# Altium footprint library 13-Pcblib_MCU.PcbLib: 48 footprints (part 1 of 3) (continued)
## FBGA-521 [mm] "BGA, 521-Leads, Body 14.0x14.0mm,  Pitch 0.50mm" (continued)
Top Overlay:
  region: -6.742,7 -7,6.742 -7,7
  region: -7.239,7.239 -7.239,7.739 -7.739,7.239
  lines w0.2: -7,6.742 -6.742,7 ; -7,-7 -7,7 7,7 7,-7 -7,-7
Mechanical 13:
  lines w0.1: -7,-7 -7,7 7,7 7,-7 -7,-7
Mechanical 15:
  lines w0.1: -0.5,0 0.5,0 ; 0,-0.5 0,0.5 ; -8,-8 -8,8 8,8 8,-8 -8,-8
3D body: height 1.5, standoff 0.3, extent -7,-7 7,7

## FBGA-580 [mm] "BGA, 580-Leads, Body 14.0x14.0mm,  Pitch 0.50mm"
height 1.5
pads (580):
  round 0.3 smd: A1(-6.5,6.5) A2(-6,6.5) A3(-5.5,6.5) A4(-5,6.5) A5(-4.5,6.5) A6(-4,6.5) A7(-3.5,6.5) A8(-3,6.5) A9(-2.5,6.5) A10(-2,6.5) A11(-1.5,6.5) A12(-1,6.5) A13(-0.5,6.5) A14(0,6.5) A15(0.5,6.5) A16(1,6.5) A17(1.5,6.5) A18(2,6.5) A19(2.5,6.5) A20(3,6.5) A21(3.5,6.5) A22(4,6.5) A23(4.5,6.5) A24(5,6.5) A25(5.5,6.5) A26(6,6.5) A27(6.5,6.5) AA1(-6.5,-3.5) AA2(-6,-3.5) AA3(-5.5,-3.5) AA4(-5,-3.5) AA6(-4,-3.5) AA7(-3.5,-3.5) AA8(-3,-3.5) AA9(-2.5,-3.5) AA10(-2,-3.5) AA11(-1.5,-3.5) AA12(-1,-3.5) AA13(-0.5,-3.5) AA14(0,-3.5) AA15(0.5,-3.5) AA16(1,-3.5) AA17(1.5,-3.5) AA18(2,-3.5) AA19(2.5,-3.5) AA20(3,-3.5) AA21(3.5,-3.5) AA22(4,-3.5) AA24(5,-3.5) AA25(5.5,-3.5) AA26(6,-3.5) AA27(6.5,-3.5) AB1(-6.5,-4) AB2(-6,-4) AB3(-5.5,-4) AB7(-3.5,-4) AB8(-3,-4) AB9(-2.5,-4) AB10(-2,-4) AB11(-1.5,-4) AB12(-1,-4) AB13(-0.5,-4) AB14(0,-4) AB15(0.5,-4) AB16(1,-4) AB17(1.5,-4) AB18(2,-4) AB19(2.5,-4) AB20(3,-4) AB21(3.5,-4) AB25(5.5,-4) AB26(6,-4) AB27(6.5,-4) AC1(-6.5,-4.5) AC2(-6,-4.5) AC3(-5.5,-4.5) AC25(5.5,-4.5) AC26(6,-4.5) AC27(6.5,-4.5) AD1(-6.5,-5) AD2(-6,-5) AD3(-5.5,-5) AD7(-3.5,-5) AD8(-3,-5) AD9(-2.5,-5) AD10(-2,-5) AD11(-1.5,-5) AD12(-1,-5) AD13(-0.5,-5) AD14(0,-5) AD15(0.5,-5) AD16(1,-5) AD17(1.5,-5) AD18(2,-5) AD19(2.5,-5) AD20(3,-5) AD21(3.5,-5) AD25(5.5,-5) AD26(6,-5) AD27(6.5,-5) AE1(-6.5,-5.5) AE2(-6,-5.5) AE3(-5.5,-5.5) AE4(-5,-5.5) AE5(-4.5,-5.5) AE6(-4,-5.5) AE7(-3.5,-5.5) AE8(-3,-5.5) AE9(-2.5,-5.5) AE10(-2,-5.5) AE11(-1.5,-5.5) AE12(-1,-5.5) AE13(-0.5,-5.5) AE14(0,-5.5) AE15(0.5,-5.5) AE16(1,-5.5) AE17(1.5,-5.5) AE18(2,-5.5) AE19(2.5,-5.5) AE20(3,-5.5) AE21(3.5,-5.5) AE22(4,-5.5) AE23(4.5,-5.5) AE24(5,-5.5) AE25(5.5,-5.5) AE26(6,-5.5) AE27(6.5,-5.5) AF1(-6.5,-6) AF2(-6,-6) AF3(-5.5,-6) AF4(-5,-6) AF5(-4.5,-6) AF6(-4,-6) AF7(-3.5,-6) AF8(-3,-6) AF9(-2.5,-6) AF10(-2,-6) AF11(-1.5,-6) AF12(-1,-6) AF13(-0.5,-6) AF14(0,-6) AF15(0.5,-6) AF16(1,-6) AF17(1.5,-6) AF18(2,-6) AF19(2.5,-6) AF20(3,-6) AF21(3.5,-6) AF22(4,-6) AF23(4.5,-6) AF24(5,-6) AF25(5.5,-6) AF26(6,-6) AF27(6.5,-6) AG1(-6.5,-6.5) AG2(-6,-6.5) AG3(-5.5,-6.5) AG4(-5,-6.5) AG5(-4.5,-6.5) AG6(-4,-6.5) AG7(-3.5,-6.5) AG8(-3,-6.5) AG9(-2.5,-6.5) AG10(-2,-6.5) AG11(-1.5,-6.5) AG12(-1,-6.5) AG13(-0.5,-6.5) AG14(0,-6.5) AG15(0.5,-6.5) AG16(1,-6.5) AG17(1.5,-6.5) AG18(2,-6.5) AG19(2.5,-6.5) AG20(3,-6.5) AG21(3.5,-6.5) AG22(4,-6.5) AG23(4.5,-6.5) AG24(5,-6.5) AG25(5.5,-6.5) AG26(6,-6.5) AG27(6.5,-6.5) B1(-6.5,6) B2(-6,6) B3(-5.5,6) B4(-5,6) B5(-4.5,6) B6(-4,6) B7(-3.5,6) B8(-3,6) B9(-2.5,6) B10(-2,6) B11(-1.5,6) B12(-1,6) B13(-0.5,6) B14(0,6) B15(0.5,6) B16(1,6) B17(1.5,6) B18(2,6) B19(2.5,6) B20(3,6) B21(3.5,6) B22(4,6) B23(4.5,6) B24(5,6) B25(5.5,6) B26(6,6) B27(6.5,6) C1(-6.5,5.5) C2(-6,5.5) C3(-5.5,5.5) C4(-5,5.5) C5(-4.5,5.5) C6(-4,5.5) C7(-3.5,5.5) C8(-3,5.5) C9(-2.5,5.5) C10(-2,5.5) C11(-1.5,5.5) C12(-1,5.5) C13(-0.5,5.5) C14(0,5.5) C15(0.5,5.5) C16(1,5.5) C17(1.5,5.5) C18(2,5.5) C19(2.5,5.5) C20(3,5.5) C21(3.5,5.5) C22(4,5.5) C23(4.5,5.5) C24(5,5.5) C25(5.5,5.5) C26(6,5.5) C27(6.5,5.5) D1(-6.5,5) D2(-6,5) D3(-5.5,5) D7(-3.5,5) D8(-3,5) D9(-2.5,5) D10(-2,5) D11(-1.5,5) D12(-1,5) D13(-0.5,5) D14(0,5) D15(0.5,5) D16(1,5) D17(1.5,5) D18(2,5) D19(2.5,5) D20(3,5) D21(3.5,5) D25(5.5,5) D26(6,5) D27(6.5,5) E1(-6.5,4.5) E2(-6,4.5) E3(-5.5,4.5) E25(5.5,4.5) E26(6,4.5) E27(6.5,4.5) F1(-6.5,4) F2(-6,4) F3(-5.5,4) F7(-3.5,4) F8(-3,4) F9(-2.5,4) F10(-2,4) F11(-1.5,4) F12(-1,4) F13(-0.5,4) F14(0,4) F15(0.5,4) F16(1,4) F17(1.5,4) F18(2,4) F19(2.5,4) F20(3,4) F21(3.5,4) F25(5.5,4) F26(6,4) F27(6.5,4) G1(-6.5,3.5) G2(-6,3.5) G3(-5.5,3.5) G4(-5,3.5) G6(-4,3.5) G7(-3.5,3.5) G8(-3,3.5) G9(-2.5,3.5) G10(-2,3.5) G11(-1.5,3.5) G12(-1,3.5) G13(-0.5,3.5) G14(0,3.5) G15(0.5,3.5) G16(1,3.5) G17(1.5,3.5) G18(2,3.5) G19(2.5,3.5) G20(3,3.5) G21(3.5,3.5) G22(4,3.5) G24(5,3.5) G25(5.5,3.5) G26(6,3.5) G27(6.5,3.5) H1(-6.5,3) H2(-6,3) H3(-5.5,3) H4(-5,3) H6(-4,3) H7(-3.5,3) H8(-3,3) H9(-2.5,3) H10(-2,3) H11(-1.5,3) H12(-1,3) H13(-0.5,3) H14(0,3) H15(0.5,3) H16(1,3) H17(1.5,3) H18(2,3) H19(2.5,3) H20(3,3) H21(3.5,3) H22(4,3) H24(5,3) H25(5.5,3) H26(6,3) H27(6.5,3) J1(-6.5,2.5) J2(-6,2.5) J3(-5.5,2.5) J4(-5,2.5) J6(-4,2.5) J7(-3.5,2.5) J8(-3,2.5) J20(3,2.5) J21(3.5,2.5) J22(4,2.5) J24(5,2.5) J25(5.5,2.5) J26(6,2.5) J27(6.5,2.5) K1(-6.5,2) K2(-6,2) K3(-5.5,2) K4(-5,2) K6(-4,2) K7(-3.5,2) K8(-3,2) K11(-1.5,2) K12(-1,2) K13(-0.5,2) K14(0,2) K15(0.5,2) K16(1,2) K17(1.5,2) K20(3,2) K21(3.5,2) K22(4,2) K24(5,2) K25(5.5,2) K26(6,2) K27(6.5,2) L1(-6.5,1.5) L2(-6,1.5) L3(-5.5,1.5) L4(-5,1.5) L6(-4,1.5) L7(-3.5,1.5) L8(-3,1.5) L10(-2,1.5) L11(-1.5,1.5) L12(-1,1.5) L13(-0.5,1.5) L14(0,1.5) L15(0.5,1.5) L16(1,1.5) L17(1.5,1.5) L18(2,1.5) L20(3,1.5) L21(3.5,1.5) L22(4,1.5) L24(5,1.5) L25(5.5,1.5) L26(6,1.5) L27(6.5,1.5) M1(-6.5,1) M2(-6,1) M3(-5.5,1) M4(-5,1) M6(-4,1) M7(-3.5,1) M8(-3,1) M10(-2,1) M11(-1.5,1) M12(-1,1) M13(-0.5,1) M14(0,1) M15(0.5,1) M16(1,1) M17(1.5,1) M18(2,1) M20(3,1) M21(3.5,1) M22(4,1) M24(5,1) M25(5.5,1) M26(6,1) M27(6.5,1) N1(-6.5,0.5) N2(-6,0.5) N3(-5.5,0.5) N4(-5,0.5) N6(-4,0.5) N7(-3.5,0.5) N8(-3,0.5) N10(-2,0.5) N11(-1.5,0.5) N12(-1,0.5) N16(1,0.5) N17(1.5,0.5) N18(2,0.5) N20(3,0.5) N21(3.5,0.5) N22(4,0.5) N24(5,0.5) N25(5.5,0.5) N26(6,0.5) N27(6.5,0.5) P1(-6.5,0) P2(-6,0) P3(-5.5,0) P4(-5,0) P6(-4,0) P7(-3.5,0) P8(-3,0) P10(-2,0) P11(-1.5,0) P12(-1,0) P16(1,0) P17(1.5,0) P18(2,0) P20(3,0) P21(3.5,0) P22(4,0) P24(5,0) P25(5.5,0) P26(6,0) P27(6.5,0) R1(-6.5,-0.5) R2(-6,-0.5) R3(-5.5,-0.5) R4(-5,-0.5) R6(-4,-0.5) R7(-3.5,-0.5) R8(-3,-0.5) R10(-2,-0.5) R11(-1.5,-0.5) R12(-1,-0.5) R16(1,-0.5) R17(1.5,-0.5) R18(2,-0.5) R20(3,-0.5) R21(3.5,-0.5) R22(4,-0.5) R24(5,-0.5) R25(5.5,-0.5) R26(6,-0.5) R27(6.5,-0.5) T1(-6.5,-1) T2(-6,-1) T3(-5.5,-1) T4(-5,-1) T6(-4,-1) T7(-3.5,-1) T8(-3,-1) T10(-2,-1) T11(-1.5,-1) T12(-1,-1) T13(-0.5,-1) T14(0,-1) T15(0.5,-1) T16(1,-1) T17(1.5,-1) T18(2,-1) T20(3,-1) T21(3.5,-1) T22(4,-1) T24(5,-1) T25(5.5,-1) T26(6,-1) T27(6.5,-1) U1(-6.5,-1.5) U2(-6,-1.5) U3(-5.5,-1.5) U4(-5,-1.5) U6(-4,-1.5) U7(-3.5,-1.5) U8(-3,-1.5) U10(-2,-1.5) U11(-1.5,-1.5) U12(-1,-1.5) U13(-0.5,-1.5) U14(0,-1.5) U15(0.5,-1.5) U16(1,-1.5) U17(1.5,-1.5) U18(2,-1.5) U20(3,-1.5) U21(3.5,-1.5) U22(4,-1.5) U24(5,-1.5) U25(5.5,-1.5) U26(6,-1.5) U27(6.5,-1.5) V1(-6.5,-2) V2(-6,-2) V3(-5.5,-2) V4(-5,-2) V6(-4,-2) V7(-3.5,-2) V8(-3,-2) V11(-1.5,-2) V12(-1,-2) V13(-0.5,-2) V14(0,-2) V15(0.5,-2) V16(1,-2) V17(1.5,-2) V20(3,-2) V21(3.5,-2) V22(4,-2) V24(5,-2) V25(5.5,-2) V26(6,-2) V27(6.5,-2) W1(-6.5,-2.5) W2(-6,-2.5) W3(-5.5,-2.5) W4(-5,-2.5) W6(-4,-2.5) W7(-3.5,-2.5) W8(-3,-2.5) W20(3,-2.5) W21(3.5,-2.5) W22(4,-2.5) W24(5,-2.5) W25(5.5,-2.5) W26(6,-2.5) W27(6.5,-2.5) Y1(-6.5,-3) Y2(-6,-3) Y3(-5.5,-3) Y4(-5,-3) Y6(-4,-3) Y7(-3.5,-3) Y8(-3,-3) Y9(-2.5,-3) Y10(-2,-3) Y11(-1.5,-3) Y12(-1,-3) Y13(-0.5,-3) Y14(0,-3) Y15(0.5,-3) Y16(1,-3) Y17(1.5,-3) Y18(2,-3) Y19(2.5,-3) Y20(3,-3) Y21(3.5,-3) Y22(4,-3) Y24(5,-3) Y25(5.5,-3) Y26(6,-3) Y27(6.5,-3)
Top Overlay:
  region: -6.742,7 -7,6.742 -7,7
  region: -7.243,7.243 -7.243,7.743 -7.743,7.243
  lines w0.2: -7,6.742 -6.742,7 ; -7,-7 -7,7 7,7 7,-7 -7,-7
Mechanical 13:
  lines w0.1: -7,-7 -7,7 7,7 7,-7 -7,-7
Mechanical 15:
  lines w0.1: -0.5,0 0.5,0 ; 0,-0.5 0,0.5 ; -8,-8 -8,8 8,8 8,-8 -8,-8
3D body: height 1.5, standoff 0.3, extent -7,-7 7,7

## FSC7002 [mm]
height 4.57
pads (64):
  rect 0.28x1.5 smd: 1(1.3,4.67) 2(0.8,4.67) 3(0.3,4.67) 4(-0.2,4.67) 5(-0.7,4.67) 6(-1.2,4.67) 7(-1.7,4.67) 8(-2.2,4.67) 9(-2.7,4.67) 10(-3.2,4.67) 11(-3.7,4.67) 12(-4.2,4.67) 13(-4.7,4.67) 14(-5.2,4.67) 15(-5.7,4.67) 16(-6.2,4.67) 33(-6.2,-6.83) 34(-5.7,-6.83) 35(-5.2,-6.83) 36(-4.7,-6.83) 37(-4.2,-6.83) 38(-3.7,-6.83) 39(-3.2,-6.83) 40(-2.7,-6.83) 41(-2.2,-6.83) 42(-1.7,-6.83) 43(-1.2,-6.83) 44(-0.7,-6.83) 45(-0.2,-6.83) 46(0.3,-6.83) 47(0.8,-6.83) 48(1.3,-6.83)
  rect 1.5x0.28 smd: 17(-8.2,2.67) 18(-8.2,2.17) 19(-8.2,1.67) 20(-8.2,1.17) 21(-8.2,0.67) 22(-8.2,0.17) 23(-8.2,-0.33) 24(-8.2,-0.83) 25(-8.2,-1.33) 26(-8.2,-1.83) 27(-8.2,-2.33) 28(-8.2,-2.83) 29(-8.2,-3.33) 30(-8.2,-3.83) 31(-8.2,-4.33) 32(-8.2,-4.83) 49(3.3,-4.83) 50(3.3,-4.33) 51(3.3,-3.83) 52(3.3,-3.33) 53(3.3,-2.83) 54(3.3,-2.33) 55(3.3,-1.83) 56(3.3,-1.33) 57(3.3,-0.83) 58(3.3,-0.33) 59(3.3,0.17) 60(3.3,0.67) 61(3.3,1.17) 62(3.3,1.67) 63(3.3,2.17) 64(3.3,2.67)
Top Overlay:
  circle w0.2: c0.665,2.01 r0.54
  lines w0.2: -6.665,-5.295 -6.665,3.135 0.23,3.135 1.765,3.135 1.765,1.6 1.765,-5.295 -6.665,-5.295

## LQFP48 [mil]
pads (50):
  rect 78x12 smd: 1(0.46,0.19) 2(0.46,-19.81) 3(0.46,-39.81) 4(0.46,-59.81) 5(0.46,-79.81) 6(0.46,-99.81) 7(0.46,-119.81) 8(0.46,-139.81) 9(0.46,-159.81) 10(0.46,-179.81) 11(0.46,-199.81) 12(0.46,-219.81) 25(354.46,-219.81) 26(354.46,-199.81) 27(354.46,-179.81) 28(354.46,-159.81) 29(354.46,-139.81) 30(354.46,-119.81) 31(354.46,-99.81) 32(354.46,-79.81) 33(354.46,-59.81) 34(354.46,-39.81) 35(354.46,-19.81) 36(354.46,0.19)
  rect 12x78 smd: 13(67.46,-286.81) 14(87.46,-286.81) 15(107.46,-286.81) 16(127.46,-286.81) 17(147.46,-286.81) 18(167.46,-286.81) 19(187.46,-286.81) 20(207.46,-286.81) 21(227.46,-286.81) 22(247.46,-286.81) 23(267.46,-286.81) 24(287.46,-286.81) 37(287.46,67.19) 38(267.46,67.19) 39(247.46,67.19) 40(227.46,67.19) 41(207.46,67.19) 42(187.46,67.19) 43(167.46,67.19) 44(147.46,67.19) 45(127.46,67.19) 46(107.46,67.19) 47(87.46,67.19) 48(67.46,67.19)
  round 30 smd: ""(20.46,-264.81) ""(330.46,45.19)
Top Overlay:
  circle w10: c100.46,-49.81 r11.18
  lines w10: 0.46,-234.81 0.46,-284.81 50.46,-284.81 ; 0.46,15.19 0.46,30.19 35.46,65.19 50.46,65.19 ; 300.46,-284.81 355.46,-284.81 355.46,-234.81 ; 305.46,65.19 350.46,65.19 350.46,15.19 ; 59.46,-227.81 59.46,-50.81 118.46,8.19 295.46,8.19 295.46,-227.81 59.46,-227.81
3D body: height 57.09, standoff 0, extent 0.67,-288.17 355,66.17

## LQFP48 - 1 [mil]
height 43.31
pads (48):
  rect 8x50 smd: 1(-110,-173) 2(-90,-173) 3(-70,-173) 4(-50,-173) 5(-30,-173) 6(-10,-173) 7(10,-173) 8(30,-173) 9(50,-173) 10(70,-173) 11(90,-173) 12(110,-173) 25(110,173) 26(90,173) 27(70,173) 28(50,173) 29(30,173) 30(10,173) 31(-10,173) 32(-30,173) 33(-50,173) 34(-70,173) 35(-90,173) 36(-110,173)
  rect 50x8 smd: 13(173,-110) 14(173,-90) 15(173,-70) 16(173,-50) 17(173,-30) 18(173,-10) 19(173,10) 20(173,30) 21(173,50) 22(173,70) 23(173,90) 24(173,110) 37(-173,110) 38(-173,90) 39(-173,70) 40(-173,50) 41(-173,30) 42(-173,10) 43(-173,-10) 44(-173,-30) 45(-173,-50) 46(-173,-70) 47(-173,-90) 48(-173,-110)
Top Overlay:
  lines w3: -145,-183 -130,-173 -145,-163 -145,-183
  lines w10: -130,-110 -130,130 130,130 130,-130 -110,-130 -130,-110

## LQFP48_L [mm] "Thin QFP, 48-Leads, Body 7x7mm, Pitch 0.5mm, IPC High Density"
height 1.6
pads (48):
  oval 1.55x0.25 smd: 1(-4.025,2.75) 2(-4.025,2.25) 3(-4.025,1.75) 4(-4.025,1.25) 5(-4.025,0.75) 6(-4.025,0.25) 7(-4.025,-0.25) 8(-4.025,-0.75) 9(-4.025,-1.25) 10(-4.025,-1.75) 11(-4.025,-2.25) 12(-4.025,-2.75) 25(4.025,-2.75) 26(4.025,-2.25) 27(4.025,-1.75) 28(4.025,-1.25) 29(4.025,-0.75) 30(4.025,-0.25) 31(4.025,0.25) 32(4.025,0.75) 33(4.025,1.25) 34(4.025,1.75) 35(4.025,2.25) 36(4.025,2.75)
  oval 0.25x1.55 smd: 13(-2.75,-4.025) 14(-2.25,-4.025) 15(-1.75,-4.025) 16(-1.25,-4.025) 17(-0.75,-4.025) 18(-0.25,-4.025) 19(0.25,-4.025) 20(0.75,-4.025) 21(1.25,-4.025) 22(1.75,-4.025) 23(2.25,-4.025) 24(2.75,-4.025) 37(2.75,4.025) 38(2.25,4.025) 39(1.75,4.025) 40(1.25,4.025) 41(0.75,4.025) 42(0.25,4.025) 43(-0.25,4.025) 44(-0.75,4.025) 45(-1.25,4.025) 46(-1.75,4.025) 47(-2.25,4.025) 48(-2.75,4.025)
Top Overlay:
  circle w0.25: c-4.025,3.425 r0.125
  circle w0.6: c-1.85,1.85 r0.3
  lines w0.2: -2.85,-2.85 -2.85,2.85 2.85,2.85 2.85,-2.85 -2.85,-2.85
Mechanical 13:
  circle w0.1: c-2.6,2.6 r0.5
  lines w0.1: -3.5,-3.5 -3.5,3.5 3.5,3.5 3.5,-3.5 -3.5,-3.5
Mechanical 15:
  lines w0.1: -0.5,0 0.5,0 ; 0,-0.5 0,0.5 ; -4.9,-4.9 -4.9,4.9 4.9,4.9 4.9,-4.9 -4.9,-4.9
3D body: height 1.6, standoff 0, extent -3.5,-3.5 3.5,3.5

## LQFP48_M [mm] "Thin QFP, 48-Leads, Body 7x7mm, Pitch 0.5mm, IPC Low Density"
height 1.6
pads (48):
  oval 2.1x0.3 smd: 1(-4.1,2.75) 2(-4.1,2.25) 3(-4.1,1.75) 4(-4.1,1.25) 5(-4.1,0.75) 6(-4.1,0.25) 7(-4.1,-0.25) 8(-4.1,-0.75) 9(-4.1,-1.25) 10(-4.1,-1.75) 11(-4.1,-2.25) 12(-4.1,-2.75) 25(4.1,-2.75) 26(4.1,-2.25) 27(4.1,-1.75) 28(4.1,-1.25) 29(4.1,-0.75) 30(4.1,-0.25) 31(4.1,0.25) 32(4.1,0.75) 33(4.1,1.25) 34(4.1,1.75) 35(4.1,2.25) 36(4.1,2.75)
  oval 0.3x2.1 smd: 13(-2.75,-4.1) 14(-2.25,-4.1) 15(-1.75,-4.1) 16(-1.25,-4.1) 17(-0.75,-4.1) 18(-0.25,-4.1) 19(0.25,-4.1) 20(0.75,-4.1) 21(1.25,-4.1) 22(1.75,-4.1) 23(2.25,-4.1) 24(2.75,-4.1) 37(2.75,4.1) 38(2.25,4.1) 39(1.75,4.1) 40(1.25,4.1) 41(0.75,4.1) 42(0.25,4.1) 43(-0.25,4.1) 44(-0.75,4.1) 45(-1.25,4.1) 46(-1.75,4.1) 47(-2.25,4.1) 48(-2.75,4.1)
Top Overlay:
  circle w0.25: c-4.1,3.45 r0.125
  circle w0.6: c-1.65,1.65 r0.3
  lines w0.2: -2.65,-2.65 -2.65,2.65 2.65,2.65 2.65,-2.65 -2.65,-2.65
Mechanical 13:
  circle w0.1: c-2.6,2.6 r0.5
  lines w0.1: -3.5,-3.5 -3.5,3.5 3.5,3.5 3.5,-3.5 -3.5,-3.5
Mechanical 15:
  lines w0.1: -0.5,0 0.5,0 ; 0,-0.5 0,0.5 ; -5.65,-5.65 -5.65,5.65 5.65,5.65 5.65,-5.65 -5.65,-5.65
3D body: height 1.6, standoff 0, extent -3.5,-3.5 3.5,3.5

## LQFP48_N [mm] "Thin QFP, 48-Leads, Body 7x7mm, Pitch 0.5mm, IPC Medium Density"
height 1.6
pads (48):
  oval 1.8x0.3 smd: 1(-4.05,2.75) 2(-4.05,2.25) 3(-4.05,1.75) 4(-4.05,1.25) 5(-4.05,0.75) 6(-4.05,0.25) 7(-4.05,-0.25) 8(-4.05,-0.75) 9(-4.05,-1.25) 10(-4.05,-1.75) 11(-4.05,-2.25) 12(-4.05,-2.75) 25(4.05,-2.75) 26(4.05,-2.25) 27(4.05,-1.75) 28(4.05,-1.25) 29(4.05,-0.75) 30(4.05,-0.25) 31(4.05,0.25) 32(4.05,0.75) 33(4.05,1.25) 34(4.05,1.75) 35(4.05,2.25) 36(4.05,2.75)
  oval 0.3x1.8 smd: 13(-2.75,-4.05) 14(-2.25,-4.05) 15(-1.75,-4.05) 16(-1.25,-4.05) 17(-0.75,-4.05) 18(-0.25,-4.05) 19(0.25,-4.05) 20(0.75,-4.05) 21(1.25,-4.05) 22(1.75,-4.05) 23(2.25,-4.05) 24(2.75,-4.05) 37(2.75,4.05) 38(2.25,4.05) 39(1.75,4.05) 40(1.25,4.05) 41(0.75,4.05) 42(0.25,4.05) 43(-0.25,4.05) 44(-0.75,4.05) 45(-1.25,4.05) 46(-1.75,4.05) 47(-2.25,4.05) 48(-2.75,4.05)
Top Overlay:
  circle w0.6: c-1.75,1.75 r0.3
  circle w0.25: c-4.05,3.45 r0.125
  lines w0.2: -2.75,-2.75 2.75,-2.75 2.75,2.75 -2.75,2.75 -2.75,-2.75
Mechanical 13:
  circle w0.1: c-2.6,2.6 r0.5
  lines w0.1: -3.5,-3.5 3.5,-3.5 3.5,3.5 -3.5,3.5 -3.5,-3.5
Mechanical 15:
  lines w0.1: -0.5,0 0.5,0 ; 0,-0.5 0,0.5 ; -5.2,-5.2 5.2,-5.2 5.2,5.2 -5.2,5.2 -5.2,-5.2
3D body: height 1.6, standoff 0, extent -3.5,-3.5 3.5,3.5

## LQFP64_L [mm] "Thin QFP, 64-Leads, Body 10x10mm, Pitch 0.5mm, IPC High Density"
height 1.6
pads (64):
  oval 1.55x0.25 smd: 1(-5.525,3.75) 2(-5.525,3.25) 3(-5.525,2.75) 4(-5.525,2.25) 5(-5.525,1.75) 6(-5.525,1.25) 7(-5.525,0.75) 8(-5.525,0.25) 9(-5.525,-0.25) 10(-5.525,-0.75) 11(-5.525,-1.25) 12(-5.525,-1.75) 13(-5.525,-2.25) 14(-5.525,-2.75) 15(-5.525,-3.25) 16(-5.525,-3.75) 33(5.525,-3.75) 34(5.525,-3.25) 35(5.525,-2.75) 36(5.525,-2.25) 37(5.525,-1.75) 38(5.525,-1.25) 39(5.525,-0.75) 40(5.525,-0.25) 41(5.525,0.25) 42(5.525,0.75) 43(5.525,1.25) 44(5.525,1.75) 45(5.525,2.25) 46(5.525,2.75) 47(5.525,3.25) 48(5.525,3.75)
  oval 0.25x1.55 smd: 17(-3.75,-5.525) 18(-3.25,-5.525) 19(-2.75,-5.525) 20(-2.25,-5.525) 21(-1.75,-5.525) 22(-1.25,-5.525) 23(-0.75,-5.525) 24(-0.25,-5.525) 25(0.25,-5.525) 26(0.75,-5.525) 27(1.25,-5.525) 28(1.75,-5.525) 29(2.25,-5.525) 30(2.75,-5.525) 31(3.25,-5.525) 32(3.75,-5.525) 49(3.75,5.525) 50(3.25,5.525) 51(2.75,5.525) 52(2.25,5.525) 53(1.75,5.525) 54(1.25,5.525) 55(0.75,5.525) 56(0.25,5.525) 57(-0.25,5.525) 58(-0.75,5.525) 59(-1.25,5.525) 60(-1.75,5.525) 61(-2.25,5.525) 62(-2.75,5.525) 63(-3.25,5.525) 64(-3.75,5.525)
Top Overlay:
  circle w0.25: c-5.525,4.425 r0.125
  circle w0.6: c-3.35,3.35 r0.3
  lines w0.2: -4.35,-4.35 -4.35,4.35 4.35,4.35 4.35,-4.35 -4.35,-4.35
Mechanical 13:
  circle w0.1: c-4.1,4.1 r0.5
  lines w0.1: -5,-5 -5,5 5,5 5,-5 -5,-5
Mechanical 15:
  lines w0.1: -0.5,0 0.5,0 ; 0,-0.5 0,0.5 ; -6.4,-6.4 -6.4,6.4 6.4,6.4 6.4,-6.4 -6.4,-6.4
3D body: height 1.6, standoff 0, extent -5,-5 5,5

## LQFP64_M [mm] "Thin QFP, 64-Leads, Body 10x10mm, Pitch 0.5mm, IPC Low Density"
height 1.6
pads (64):
  oval 2.1x0.3 smd: 1(-5.6,3.75) 2(-5.6,3.25) 3(-5.6,2.75) 4(-5.6,2.25) 5(-5.6,1.75) 6(-5.6,1.25) 7(-5.6,0.75) 8(-5.6,0.25) 9(-5.6,-0.25) 10(-5.6,-0.75) 11(-5.6,-1.25) 12(-5.6,-1.75) 13(-5.6,-2.25) 14(-5.6,-2.75) 15(-5.6,-3.25) 16(-5.6,-3.75) 33(5.6,-3.75) 34(5.6,-3.25) 35(5.6,-2.75) 36(5.6,-2.25) 37(5.6,-1.75) 38(5.6,-1.25) 39(5.6,-0.75) 40(5.6,-0.25) 41(5.6,0.25) 42(5.6,0.75) 43(5.6,1.25) 44(5.6,1.75) 45(5.6,2.25) 46(5.6,2.75) 47(5.6,3.25) 48(5.6,3.75)
  oval 0.3x2.1 smd: 17(-3.75,-5.6) 18(-3.25,-5.6) 19(-2.75,-5.6) 20(-2.25,-5.6) 21(-1.75,-5.6) 22(-1.25,-5.6) 23(-0.75,-5.6) 24(-0.25,-5.6) 25(0.25,-5.6) 26(0.75,-5.6) 27(1.25,-5.6) 28(1.75,-5.6) 29(2.25,-5.6) 30(2.75,-5.6) 31(3.25,-5.6) 32(3.75,-5.6) 49(3.75,5.6) 50(3.25,5.6) 51(2.75,5.6) 52(2.25,5.6) 53(1.75,5.6) 54(1.25,5.6) 55(0.75,5.6) 56(0.25,5.6) 57(-0.25,5.6) 58(-0.75,5.6) 59(-1.25,5.6) 60(-1.75,5.6) 61(-2.25,5.6) 62(-2.75,5.6) 63(-3.25,5.6) 64(-3.75,5.6)
Top Overlay:
  circle w0.6: c-3.15,3.15 r0.3
  circle w0.25: c-5.6,4.45 r0.125
  lines w0.2: -4.15,-4.15 4.15,-4.15 4.15,4.15 -4.15,4.15 -4.15,-4.15
Mechanical 13:
  circle w0.1: c-4.1,4.1 r0.5
  lines w0.1: -5,-5 5,-5 5,5 -5,5 -5,-5
Mechanical 15:
  lines w0.1: -0.5,0 0.5,0 ; 0,-0.5 0,0.5 ; -7.15,-7.15 7.15,-7.15 7.15,7.15 -7.15,7.15 -7.15,-7.15
3D body: height 1.6, standoff 0, extent -5,-5 5,5

## LQFP64_N [mm] "Thin QFP, 64-Leads, Body 10x10mm, Pitch 0.5mm, IPC Medium Density"
height 1.6
pads (64):
  oval 1.8x0.3 smd: 1(-5.55,3.75) 2(-5.55,3.25) 3(-5.55,2.75) 4(-5.55,2.25) 5(-5.55,1.75) 6(-5.55,1.25) 7(-5.55,0.75) 8(-5.55,0.25) 9(-5.55,-0.25) 10(-5.55,-0.75) 11(-5.55,-1.25) 12(-5.55,-1.75) 13(-5.55,-2.25) 14(-5.55,-2.75) 15(-5.55,-3.25) 16(-5.55,-3.75) 33(5.55,-3.75) 34(5.55,-3.25) 35(5.55,-2.75) 36(5.55,-2.25) 37(5.55,-1.75) 38(5.55,-1.25) 39(5.55,-0.75) 40(5.55,-0.25) 41(5.55,0.25) 42(5.55,0.75) 43(5.55,1.25) 44(5.55,1.75) 45(5.55,2.25) 46(5.55,2.75) 47(5.55,3.25) 48(5.55,3.75)
  oval 0.3x1.8 smd: 17(-3.75,-5.55) 18(-3.25,-5.55) 19(-2.75,-5.55) 20(-2.25,-5.55) 21(-1.75,-5.55) 22(-1.25,-5.55) 23(-0.75,-5.55) 24(-0.25,-5.55) 25(0.25,-5.55) 26(0.75,-5.55) 27(1.25,-5.55) 28(1.75,-5.55) 29(2.25,-5.55) 30(2.75,-5.55) 31(3.25,-5.55) 32(3.75,-5.55) 49(3.75,5.55) 50(3.25,5.55) 51(2.75,5.55) 52(2.25,5.55) 53(1.75,5.55) 54(1.25,5.55) 55(0.75,5.55) 56(0.25,5.55) 57(-0.25,5.55) 58(-0.75,5.55) 59(-1.25,5.55) 60(-1.75,5.55) 61(-2.25,5.55) 62(-2.75,5.55) 63(-3.25,5.55) 64(-3.75,5.55)
Top Overlay:
  circle w0.6: c-3.25,3.25 r0.3
  circle w0.25: c-5.55,4.45 r0.125
  lines w0.2: -4.25,-4.25 4.25,-4.25 4.25,4.25 -4.25,4.25 -4.25,-4.25
Mechanical 13:
  circle w0.1: c-4.1,4.1 r0.5
  lines w0.1: -5,-5 5,-5 5,5 -5,5 -5,-5
Mechanical 15:
  lines w0.1: -0.5,0 0.5,0 ; 0,-0.5 0,0.5 ; -6.7,-6.7 6.7,-6.7 6.7,6.7 -6.7,6.7 -6.7,-6.7
3D body: height 1.6, standoff 0, extent -5,-5 5,5